# Altium footprint library chenjd.PcbLib: 87 footprints (part 2 of 6)
Each footprint in its own frame and in the unit in brackets; x right, y up, seen from the top. Pads: shape width x height; smd on the part's side, far side on the other; paste and mask are expansions set on the pad; w line width, h text height; cw(c..) or ccw(c..) is an arc to the next point about the centre after c.
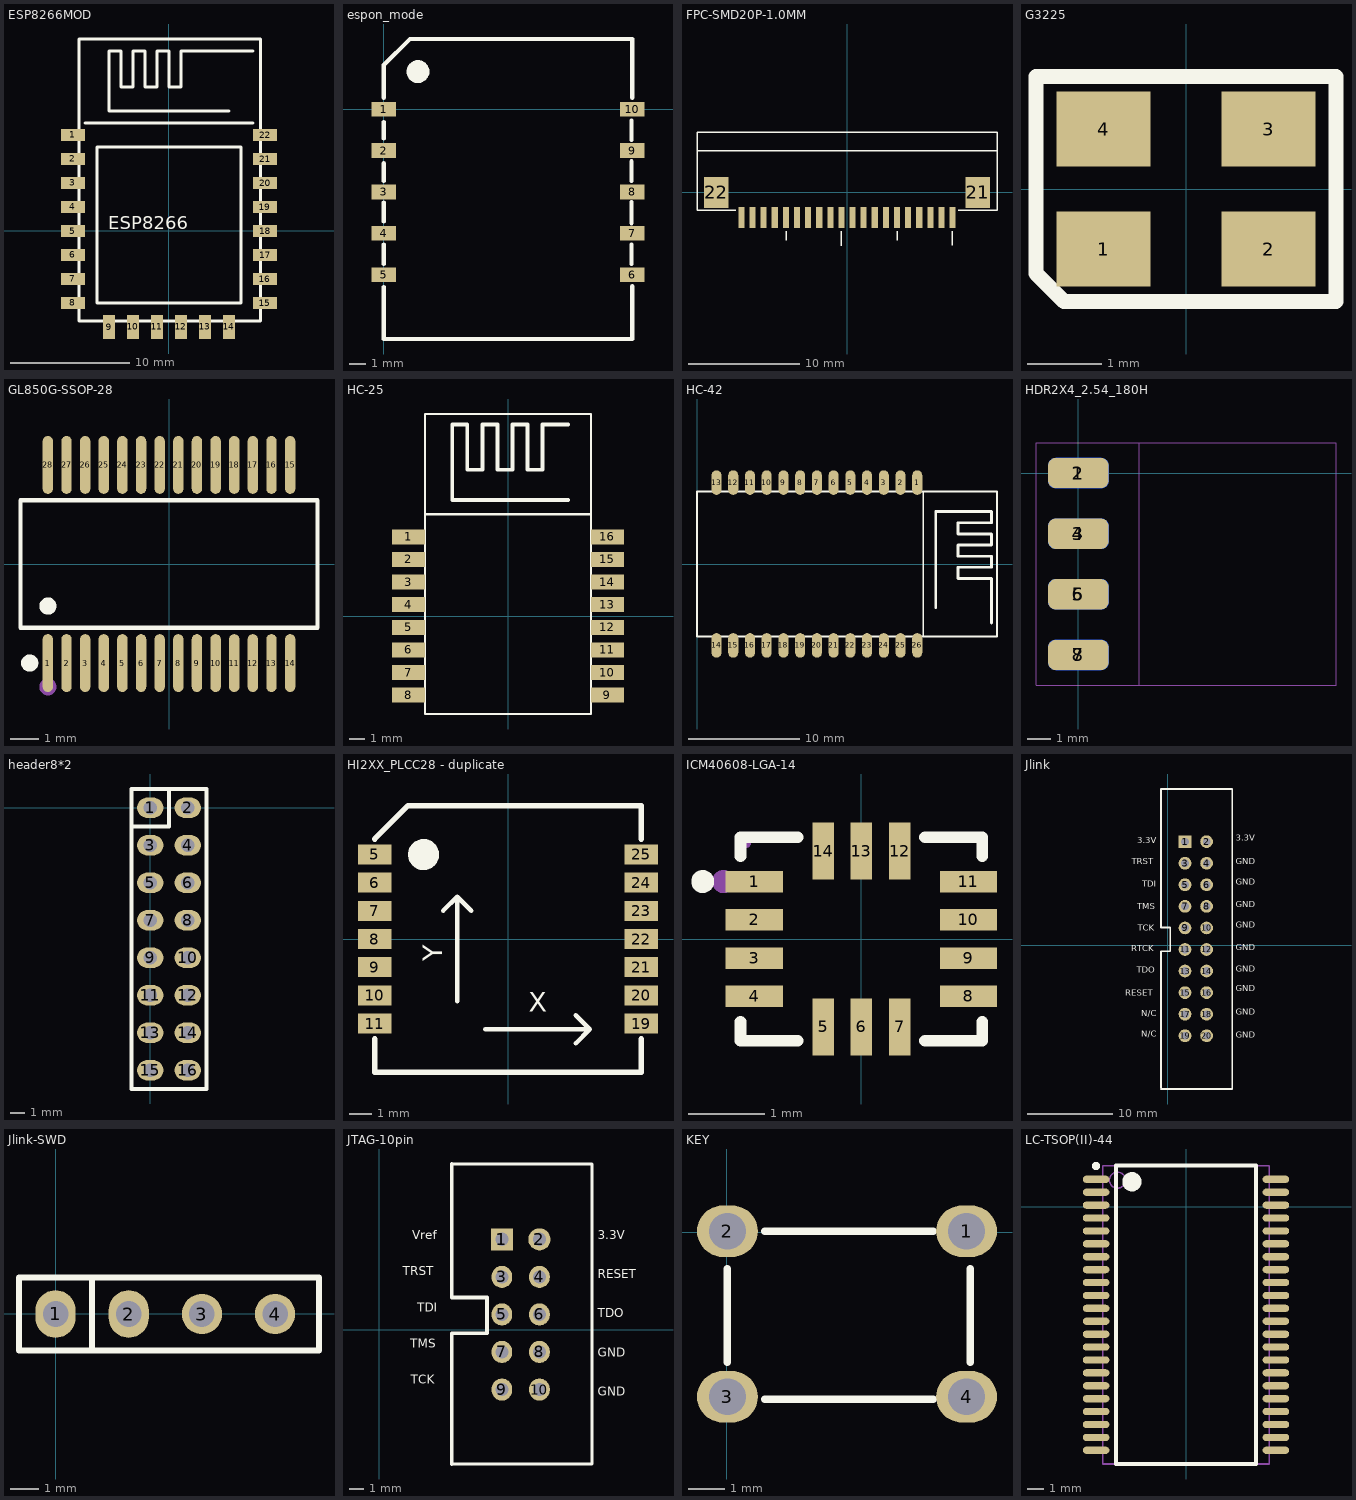
[diagram p1: the footprints below, top view; thin cyan lines are the x and y axes]

## ESP8266MOD [mm] "ESP8266模块"
pads (22):
  rect 2x1 smd: 1(-8.002,8) 2(-8.002,6) 3(-8.002,4.001) 4(-8.002,2.001) 5(-8.002,0) 6(-8.002,-1.999) 7(-8.002,-3.999) 8(-8.001,-5.999) 15(7.999,-6.005) 16(8,-4.001) 17(8.002,-2.003) 18(8.001,-0.002) 19(8,1.998) 20(8.001,3.998) 21(8,5.998) 22(8.001,7.998)
  rect 1x2 smd: 9(-5,-8) 10(-3.002,-7.999) 11(-1.003,-7.999) 12(0.998,-7.999) 13(2.997,-7.999) 14(4.997,-8)
Top Overlay:
  lines w0.254: -7.002,9.001 6.998,9.001 ; 4.998,10.001 -5.002,10.001 -5.002,15.001 -4.002,15.001 -4.002,12.001 -3.002,12.001 -3.002,15.001 -2.002,15.001 -2.002,12.001 -1.002,12.001 -1.002,15.001 -0.002,15.001 -0.002,12.001 0.998,12.001 0.998,15.001 6.998,15.001 ; -7.493,-7.493 -7.493,16.001 7.62,16.001 7.62,-7.493 -7.493,-7.493 ; -6.002,-5.999 5.998,-5.999 5.998,7.001 -6.002,7.001 -6.002,-5.999
  text "ESP8266" at -5.08,0.127 h1.1
3D body "EPS8266 ESP-12E.STEP": height 2.65, standoff -0.04, extent -8.005,-7.687 8.005,16.318

## espon_mode [mm] "espon_mode"
pads (10):
  rect 1.5x0.9 smd: 1(0,0) 2(0,-2.54) 3(0,-5.08) 4(0,-7.62) 5(0,-10.16) 6(15.24,-10.16) 7(15.24,-7.62) 8(15.24,-5.08) 9(15.24,-2.54) 10(15.24,0)
Top Overlay:
  circle w0.7: c2.1,2.3 r0.35
  lines w0.254: 0,-10.9 0,-14.1 15.24,-14.1 15.24,-10.864 ; 0,-9.5 0,-8.3 ; 0,-6.9 0,-5.724 ; 0,-4.4 0,-3.324 ; 0,-1.8 0,-0.8 ; 0,0.7 0,2.7 1.6,4.3 4.5,4.3 15.24,4.3 15.24,0.7 ; 15.2,-9.5 15.2,-8.3 ; 15.2,-7 15.2,-5.7 ; 15.2,-4.4 15.2,-3.2 ; 15.2,-1.9 15.2,-0.7

## FPC-SMD20P-1.0MM [mm]
pads (22):
  rect 0.55x1.905 smd: 1(-9.5,-2.25) 2(-8.5,-2.25) 3(-7.5,-2.25) 4(-6.5,-2.25) 5(-5.5,-2.25) 6(-4.5,-2.25) 7(-3.5,-2.25) 8(-2.5,-2.25) 9(-1.5,-2.25) 10(-0.5,-2.25) 11(0.5,-2.25) 12(1.5,-2.25) 13(2.5,-2.25) 14(3.5,-2.25) 15(4.5,-2.25) 16(5.5,-2.25) 17(6.5,-2.25) 18(7.5,-2.25) 19(8.5,-2.25) 20(9.5,-2.25)
  rect 2.21x2.794 smd: 21(11.75,0) 22(-11.75,0)
Top Overlay:
  lines w0.127: -13.5,3.75 13.5,3.75 ; -10,-1.6 -13.5,-1.6 -13.5,5.4 13.5,5.4 13.5,-1.6 10,-1.6 ; -5.49,-4.314 -5.49,-3.514 ; -0.5,-4.784 -0.5,-3.514 ; 4.51,-4.314 4.51,-3.514 ; 9.49,-4.774 9.49,-3.504

## G3225 [mil] "3225贴片晶振"
height 40
pads (4):
  rect 50x40 smd: 1(-44,-32) 2(44,-32) 3(44,32) 4(-44,32)
Top Overlay:
  lines w8: -80,-45 -65,-60 80,-60 80,60 -80,60 -80,-45
3D body "Siward_SX3225_.STEP": height 31.89, standoff 0, extent -62.99,-49.21 63,49.22

## GL850G-SSOP-28 [mm] "GL850G集线器芯片"
pads (28):
  oval 0.364x2.015 smd: 1(-4.225,-3.455) 2(-3.575,-3.455) 3(-2.925,-3.455) 4(-2.275,-3.455) 5(-1.625,-3.455) 6(-0.975,-3.455) 7(-0.325,-3.455) 8(0.325,-3.455) 9(0.975,-3.455) 10(1.625,-3.455) 11(2.275,-3.455) 12(2.925,-3.455) 13(3.575,-3.455) 14(4.225,-3.455) 15(4.225,3.455) 16(3.575,3.455) 17(2.925,3.455) 18(2.275,3.455) 19(1.625,3.455) 20(0.975,3.455) 21(0.325,3.455) 22(-0.325,3.455) 23(-0.975,3.455) 24(-1.625,3.455) 25(-2.275,3.455) 26(-2.925,3.455) 27(-3.575,3.455) 28(-4.225,3.455)
Top Overlay:
  circle w0.3: c-4.225,-1.467 r0.15
  circle w0.3: c-4.859,-3.455 r0.15
  lines w0.152: -5.181,-2.219 -5.181,2.219 5.181,2.219 5.181,-2.219 -5.181,-2.219
Mechanical 15:
  circle w0.3: c-4.225,-4.285 r0.15

## HC-25 [mm] "HC-25wifi模块"
pads (16):
  rect 2.2x1 smd: 1(-6.6,5.25) 2(-6.6,3.75) 3(-6.6,2.25) 4(-6.6,0.75) 5(-6.6,-0.75) 6(-6.6,-2.25) 7(-6.6,-3.75) 8(-6.6,-5.25) 9(6.6,-5.25) 10(6.6,-3.75) 11(6.6,-2.25) 12(6.6,-0.75) 13(6.6,0.75) 14(6.6,2.25) 15(6.6,3.75) 16(6.6,5.25)
Top Overlay:
  lines w0.152: -5.5,6.75 -5.5,13.4 5.5,13.4 5.5,6.75 ; -5.5,6.75 -5.5,-6.5 5.5,-6.5 5.5,6.75 ; -5.5,6.75 5.5,6.75
  lines w0.254: 4,7.701 -3.702,7.701 -3.702,12.701 -2.702,12.701 -2.702,9.701 -1.702,9.701 -1.702,12.701 -0.702,12.701 -0.702,9.701 0.298,9.701 0.298,12.701 1.298,12.701 1.298,9.701 2.298,9.701 2.298,12.701 4,12.701

## HC-42 [mm] "HC-42蓝牙模块"
pads (26):
  oval 0.9x2.2 smd: 1(19.75,7.3) 2(18.25,7.3) 3(16.75,7.3) 4(15.25,7.3) 5(13.75,7.3) 6(12.25,7.3) 7(10.75,7.3) 8(9.25,7.3) 9(7.75,7.3) 10(6.25,7.3) 11(4.75,7.3) 12(3.25,7.3) 13(1.75,7.3) 14(1.75,-7.3) 15(3.25,-7.3) 16(4.75,-7.3) 17(6.25,-7.3) 18(7.75,-7.3) 19(9.25,-7.3) 20(10.75,-7.3) 21(12.25,-7.3) 22(13.75,-7.3) 23(15.25,-7.3) 24(16.75,-7.3) 25(18.25,-7.3) 26(19.75,-7.3)
Top Overlay:
  lines w0.152: 1,-6.5 0,-6.5 ; 20.3,-6.5 20.3,6.5 ; 0,-6.5 0,6.5 20.3,6.5 ; 0,-6.5 26.9,-6.5 26.9,6.5 20.3,6.5
  lines w0.254: 21.401,-3.9 21.401,4.702 26.401,4.702 26.401,3.702 23.401,3.702 23.401,2.702 26.401,2.702 26.401,1.702 23.401,1.702 23.401,0.702 26.401,0.702 26.401,-0.298 23.401,-0.298 23.401,-1.298 26.401,-1.298 26.401,-5.3

## HDR2X4_2.54_180H [mm]
height 4.3
pads (8):
  rrect50% 2.54x1.27 smd: 1(0,0) 3(0,-2.54) 5(0,-5.08) 7(0,-7.62)
  rrect50% 2.54x1.27 smd far side: 2(0,0) 4(0,-2.54) 6(0,-5.08) 8(0,-7.62)
Mechanical 13:
  lines w0.051: -1.778,-8.89 -1.778,1.27 10.795,1.27 10.795,-8.89 -1.778,-8.89
Mechanical 14:
  lines w0.051: -1.778,-8.89 -1.778,1.27 2.54,1.27 2.54,-8.89 -1.778,-8.89
Mechanical 15:
  lines w0.051: -1.778,-8.89 -1.778,1.27 2.54,1.27 2.54,-8.89 -1.778,-8.89
3D body "pin_header_awl254-dg-g08d.stp": height 2.54, standoff -2.54, extent -0.968,-8.89 10.532,1.27

## header8*2 [mil] "8*2插针"
pads (16):
  oval 70x54 hole 35: 1(0,0) 2(100,0) 3(0,-100) 4(100,-100) 5(0,-200) 6(100,-200) 7(0,-300) 8(100,-300) 9(0,-400) 10(100,-400) 11(0,-500) 12(100,-500) 13(0,-600) 14(100,-600) 15(0,-700) 16(100,-700)
Top Overlay:
  lines w10: -50,-50 50,-50 50,50 ; -50,-750 -50,50 150,50 150,-750 -50,-750
3D body "4PIN--yellow.STEP": height 452.76, standoff -118.11, extent 50.01,-350.01 150.01,49.99
3D body "4PIN--yellow.STEP": height 452.76, standoff -118.11, extent 50,-750 150,-350
3D body "4PIN--yellow.STEP": height 452.76, standoff -118.11, extent -50,-350 50,50
3D body "4PIN--yellow.STEP": height 452.76, standoff -118.11, extent -50,-750 50,-350

## HI2XX_PLCC28 - duplicate [mm]
pads (14):
  rect 1.5x0.9 smd: 5(-6,3.81) 6(-6,2.54) 7(-6,1.27) 8(-6,0) 9(-6,-1.27) 10(-6,-2.54) 11(-6,-3.81) 19(6,-3.81) 20(6,-2.54) 21(6,-1.27) 22(6,0) 23(6,1.27) 24(6,2.54) 25(6,3.81)
Top Overlay:
  circle w0.7: c-3.8,3.8 r0.35
  lines w0.2: -2.921,1.27 -2.286,1.905 ; -2.286,-2.794 -2.286,1.905 ; -1.651,1.27 -2.286,1.905 ; -1.016,-4.064 3.683,-4.064 ; 3.048,-4.699 3.683,-4.064 ; 3.048,-3.429 3.683,-4.064
  lines w0.254: -6,-4.5 -6,-6 -4.5,-6 6,-6 6,-4.5 ; -6,4.5 -4.5,6 6,6 6,4.5
  text "Y" at -2.667,-0.254 h1.52
  text "X" at 1.777,-3.556 h1.52

## ICM40608-LGA-14 [mm]
pads (14):
  rect 0.745x0.28 smd: 1(-1.398,0.75) 2(-1.398,0.25) 3(-1.398,-0.25) 4(-1.398,-0.75) 8(1.398,-0.75) 9(1.398,-0.25) 10(1.398,0.25) 11(1.398,0.75)
  rect 0.28x0.745 smd: 5(-0.5,-1.147) 6(0,-1.147) 7(0.5,-1.147) 12(0.5,1.147) 13(0,1.147) 14(-0.5,1.147)
Top Overlay:
  circle w0.15: c-2.07,0.75 r0.075
  lines w0.152: -1.576,-1.08 -1.576,-1.326 -0.831,-1.326 ; -1.576,1.08 -1.576,1.326 -0.831,1.326 ; 0.831,-1.326 1.576,-1.326 1.576,-1.08 ; 0.831,1.326 1.576,1.326 1.576,1.08
Mechanical 5:
  region: -1.5,0.875 -1.05,0.875 -1.05,0.625 -1.5,0.625
  region: -1.5,0.375 -1.05,0.375 -1.05,0.125 -1.5,0.125
  region: -1.5,-0.125 -1.05,-0.125 -1.05,-0.375 -1.5,-0.375
  region: -1.5,-0.625 -1.05,-0.625 -1.05,-0.875 -1.5,-0.875
  region: -0.625,-0.8 -0.375,-0.8 -0.375,-1.25 -0.625,-1.25
  region: -0.125,-0.8 0.125,-0.8 0.125,-1.25 -0.125,-1.25
  region: 0.375,-0.8 0.625,-0.8 0.625,-1.25 0.375,-1.25
  region: 1.5,-0.625 1.05,-0.625 1.05,-0.875 1.5,-0.875
  region: 1.5,-0.125 1.05,-0.125 1.05,-0.375 1.5,-0.375
  region: 1.5,0.375 1.05,0.375 1.05,0.125 1.5,0.125
  region: 1.5,0.875 1.05,0.875 1.05,0.625 1.5,0.625
  region: 0.375,0.8 0.625,0.8 0.625,1.25 0.375,1.25
  region: -0.125,0.8 0.125,0.8 0.125,1.25 -0.125,1.25
  region: -0.625,0.8 -0.375,0.8 -0.375,1.25 -0.625,1.25
Mechanical 6:
  circle w0.06: c-1.5,1.25 r0.03
Mechanical 15:
  circle w0.15: c-1.8,0.75 r0.075

## Jlink [mm] "jlink的母头"
pads (20):
  rect 1.5x1.5 hole 0.9: 1(2.024,12.2)
  round 1.5 hole 0.9: 2(4.564,12.2) 3(2.024,9.66) 4(4.564,9.66) 5(2.024,7.12) 6(4.564,7.12) 7(2.024,4.58) 8(4.564,4.58) 9(2.024,2.04) 10(4.564,2.04) 11(2.024,-0.5) 12(4.564,-0.5) 13(2.024,-3.04) 14(4.564,-3.04) 15(2.024,-5.58) 16(4.564,-5.58) 17(2.024,-8.12) 18(4.564,-8.12) 19(2.024,-10.66) 20(4.564,-10.66)
Top Overlay:
  lines w0.2: -0.8,-16.93 7.6,-16.93 7.6,9.799 7.6,18.4 -0.8,18.4 -0.8,10 -0.8,2.1 0.3,2.1 0.3,-0.7 -0.8,-0.7 -0.8,-16.8
  text "RESET" at -4.995,-6.225 h1.27
  text "TDO" at -3.641,-3.558 h1.27
  text "RTCK" at -4.321,-1.018 h1.27
  text "TCK" at -3.563,1.395 h1.27
  text "TMS" at -3.633,3.935 h1.27
  text "TDI" at -3.021,6.617 h1.27
  text "TRST" at -4.235,9.269 h1.27
  text "3.3V" at -3.6,11.714 h1.27
  text "3.3V" at 8,12.014 h1.27
  text "GND" at 8,-11.175 h1.27
  text "GND" at 8,-8.508 h1.27
  text "GND" at 8,-5.714 h1.27
  text "GND" at 8,-3.428 h1.27
  text "GND" at 8,-0.888 h1.27
  text "GND" at 8,1.779 h1.27
  text "GND" at 8,4.192 h1.27
  text "GND" at 8,6.859 h1.27
  text "GND" at 8,9.272 h1.27
  text "N/C" at -3.145,-8.657 h1.27
  text "N/C" at -3.145,-11.057 h1.27
3D body "HEADER.STEP": height 7.58, standoff -2.94, extent 3.294,-11.93 5.834,-9.39
3D body "HEADER.STEP": height 7.58, standoff -2.94, extent 0.754,-11.93 3.294,-9.39
3D body "HEADER.STEP": height 7.58, standoff -2.94, extent 3.294,-9.39 5.834,-6.85
3D body "HEADER.STEP": height 7.58, standoff -2.94, extent 0.754,-9.39 3.294,-6.85
3D body "HEADER.STEP": height 7.58, standoff -2.94, extent 3.294,-6.85 5.834,-4.31
3D body "HEADER.STEP": height 7.58, standoff -2.94, extent 0.754,-6.85 3.294,-4.31
3D body "HEADER.STEP": height 7.58, standoff -2.94, extent 3.294,-4.31 5.834,-1.77
3D body "HEADER.STEP": height 7.58, standoff -2.94, extent 0.754,-4.31 3.294,-1.77
3D body "HEADER.STEP": height 7.58, standoff -2.94, extent 3.294,-1.77 5.834,0.77
3D body "HEADER.STEP": height 7.58, standoff -2.94, extent 0.754,-1.77 3.294,0.77
3D body "HEADER.STEP": height 7.58, standoff -2.94, extent 3.294,0.77 5.834,3.31
3D body "HEADER.STEP": height 7.58, standoff -2.94, extent 0.754,0.77 3.294,3.31
3D body "HEADER.STEP": height 7.58, standoff -2.94, extent 3.294,3.31 5.834,5.85
3D body "HEADER.STEP": height 7.58, standoff -2.94, extent 0.754,3.31 3.294,5.85
3D body "HEADER.STEP": height 7.58, standoff -2.94, extent 3.294,5.85 5.834,8.39
3D body "HEADER.STEP": height 7.58, standoff -2.94, extent 0.754,5.85 3.294,8.39
3D body "HEADER.STEP": height 7.58, standoff -2.94, extent 3.294,8.39 5.834,10.93
3D body "HEADER.STEP": height 7.58, standoff -2.94, extent 0.754,8.39 3.294,10.93
3D body "HEADER.STEP": height 7.58, standoff -2.94, extent 3.294,10.93 5.834,13.47
3D body "HEADER.STEP": height 7.58, standoff -2.94, extent 0.754,10.93 3.294,13.47

## Jlink-SWD [mil] "Jlink下载接口"
pads (4):
  oval 55x65 hole 35: 1(0,0) 2(100,0)
  round 55 hole 35: 3(200,0) 4(300,0)
Top Overlay:
  lines w8: 50,-50 50,50 -50,50 ; -50,50 -50,-50 360,-50 360,50 -50,50
3D body "4PIN.STEP": height 452.76, standoff -118.11, extent -45,-55.34 355,44.66

## JTAG-10pin [mm] "10pin JTAG"
pads (10):
  rect 1.5x1.5 hole 0.9: 1(8.3,6.1)
  round 1.5 hole 0.9: 2(10.84,6.1)
  oval 1.397x1.5 hole 0.9: 3(8.3,3.56) 4(10.84,3.56) 5(8.3,1.02) 6(10.84,1.02) 7(8.3,-1.52) 8(10.84,-1.52) 9(8.3,-4.06) 10(10.84,-4.06)
Top Overlay:
  lines w0.2: 4.9,-9.1 14.4,-9.1 14.4,11.2 4.9,11.2
  lines w0.254: 4.9,-9.1 4.9,-0.25 7.284,-0.25 7.284,2.163 4.9,2.163 4.9,11.2
  text "TCK" at 2.143,-3.889 h1.02
  text "TMS" at 2.086,-1.439 h1.02
  text "GND" at 14.8,-4.689 h1.02
  text "GND" at 14.8,-2.039 h1.02
  text "TDI" at 2.58,1 h1.02
  text "TDO" at 14.8,0.611 h1.02
  text "RESET" at 14.8,3.261 h1.02
  text "TRST" at 1.6,3.461 h1.02
  text "3.3V" at 14.8,5.911 h1.02
  text "Vref" at 2.244,5.911 h1.02
3D body "IDC10.step": height 9.13, standoff -3.27, extent 5.32,-9.13 14.17,11.17

## KEY [mm] "四脚按键"
pads (4):
  oval 1.654x1.4 hole 1: 1(6.512,0.025) 2(0.012,0.025) 3(0.012,-4.475) 4(6.512,-4.475)
Top Overlay:
  lines w0.203: 0.012,-3.531 0.012,-0.991 ; 1.028,-4.547 5.6,-4.547 ; 1.028,0.025 5.6,0.025 ; 6.616,-3.531 6.616,-0.991
3D body "TSW DIP-6x6x5.STEP": height 4.95, standoff -3.45, extent -0.804,-5.286 7.408,0.714

## LC-TSOP(II)-44 [mm] "SRAM:IS62WV51216"
pads (44):
  oval 1.65x0.45 smd: 1(-5.588,1.688) 2(-5.588,0.888) 3(-5.588,0.088) 4(-5.588,-0.712) 5(-5.588,-1.512) 6(-5.588,-2.312) 7(-5.588,-3.112) 8(-5.588,-3.912) 9(-5.588,-4.712) 10(-5.588,-5.512) 11(-5.588,-6.312) 12(-5.588,-7.112) 13(-5.588,-7.912) 14(-5.588,-8.712) 15(-5.588,-9.512) 16(-5.588,-10.312) 17(-5.588,-11.112) 18(-5.588,-11.912) 19(-5.588,-12.712) 20(-5.588,-13.512) 21(-5.588,-14.312) 22(-5.588,-15.112) 23(5.562,-15.112) 24(5.562,-14.312) 25(5.562,-13.512) 26(5.562,-12.712) 27(5.562,-11.912) 28(5.562,-11.112) 29(5.562,-10.312) 30(5.562,-9.512) 31(5.562,-8.712) 32(5.562,-7.912) 33(5.562,-7.112) 34(5.562,-6.312) 35(5.562,-5.512) 36(5.562,-4.712) 37(5.562,-3.912) 38(5.562,-3.112) 39(5.562,-2.312) 40(5.562,-1.512) 41(5.562,-0.712) 42(5.562,0.088) 43(5.562,0.888) 44(5.562,1.688)
Top Overlay:
  circle w0.25: c-5.588,2.513 r0.125
  circle w0.6: c-3.363,1.538 r0.3
  lines w0.254: -4.363,-15.962 -4.363,2.538 4.337,2.538 4.337,-15.962 -4.363,-15.962
Mechanical 13:
  circle w0.1: c-4.263,1.638 r0.5
  lines w0.1: -5.163,-15.962 -5.163,2.538 5.137,2.538 5.137,-15.962 -5.163,-15.962